# Altium footprint library SparkFun-Retired.PCBLIB: 302 footprints (part 2 of 19)
Each footprint in its own frame and in the unit in brackets; x right, y up, seen from the top. Pads: shape width x height; smd on the part's side, far side on the other; paste and mask are expansions set on the pad; w line width, h text height; cw(c..) or ccw(c..) is an arc to the next point about the centre after c.
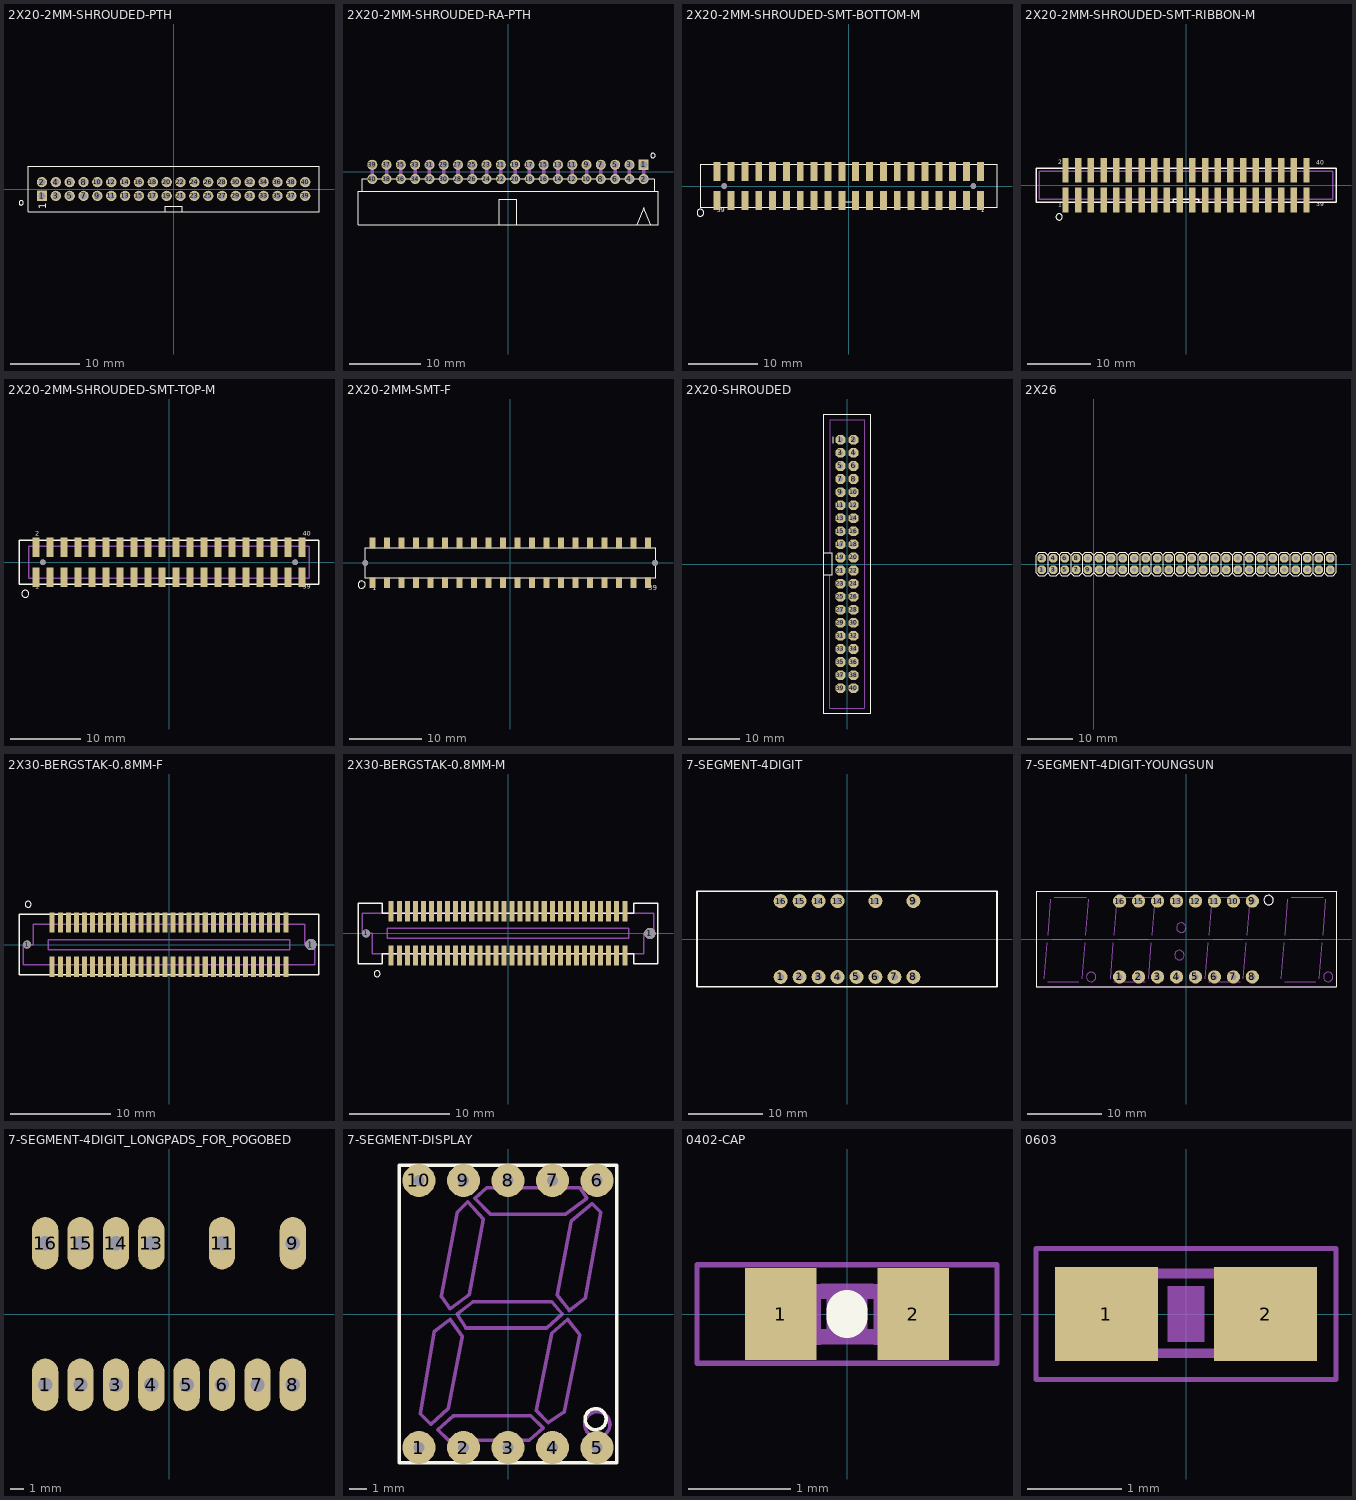
[diagram p1: the footprints below, top view; thin cyan lines are the x and y axes]

## 2X20-2MM-SHROUDED-PTH [mm]
pads (40):
  rect 1.5x1.5 hole 1: 1(-19,-1)
  round 1.5 hole 1: 2(-19,1) 3(-17,-1) 4(-17,1) 5(-15,-1) 6(-15,1) 7(-13,-1) 8(-13,1) 9(-11,-1) 10(-11,1) 11(-9,-1) 12(-9,1) 13(-7,-1) 14(-7,1) 15(-5,-1) 16(-5,1) 17(-3,-1) 18(-3,1) 19(-1,-1) 20(-1,1) 21(1,-1) 22(1,1) 23(3,-1) 24(3,1) 25(5,-1) 26(5,1) 27(7,-1) 28(7,1) 29(9,-1) 30(9,1) 31(11,-1) 32(11,1) 33(13,-1) 34(13,1) 35(15,-1) 36(15,1) 37(17,-1) 38(17,1) 39(19,-1) 40(19,1)
Top Overlay:
  circle w0: c-22,-2 r0.316
  lines w0.127: -1.2,-3.25 -21,-3.25 -21,3.25 21,3.25 21,-3.25 1.2,-3.25 ; -1.2,-3.25 -1.2,-2.5 1.2,-2.5 1.2,-3.25 ; -1.2,-3.25 1.2,-3.25
  text "1" at -18.4,-2.9 h1.08

## 2X20-2MM-SHROUDED-RA-PTH [mm]
pads (40):
  rect 1.406x1.406 hole 1: 1(19,1)
  round 1.406 hole 1: 2(19,-1) 3(17,1) 4(17,-1) 5(15,1) 6(15,-1) 7(13,1) 8(13,-1) 9(11,1) 10(11,-1) 11(9,1) 12(9,-1) 13(7,1) 14(7,-1) 15(5,1) 16(5,-1) 17(3,1) 18(3,-1) 19(1,1) 20(1,-1) 21(-1,1) 22(-1,-1) 23(-3,1) 24(-3,-1) 25(-5,1) 26(-5,-1) 27(-7,1) 28(-7,-1) 29(-9,1) 30(-9,-1) 31(-11,1) 32(-11,-1) 33(-13,1) 34(-13,-1) 35(-15,1) 36(-15,-1) 37(-17,1) 38(-17,-1) 39(-19,1) 40(-19,-1)
Top Overlay:
  circle w0: c20.3,2.3 r0.316
  lines w0.127: -20.5,-2.7 -21,-2.7 -21,-7.4 -1.2,-7.4 ; -20.5,-2.7 20.5,-2.7 ; -20.5,-2.7 -20.5,-1 20.5,-1 20.5,-2.7 ; -1.2,-7.4 1.2,-7.4 ; -1.2,-7.4 -1.2,-3.8 1.2,-3.8 1.2,-7.4 ; 1.2,-7.4 18,-7.4 ; 18,-7.4 20,-7.4 ; 18,-7.4 19,-5 20,-7.4 ; 20,-7.4 21,-7.4 21,-2.7 20.5,-2.7
Mechanical 16:
  rectangle: -19.25,-1 -18.75,1.25
  rectangle: -17.25,-1 -16.75,1.25
  rectangle: -15.25,-1 -14.75,1.25
  rectangle: -13.25,-1 -12.75,1.25
  rectangle: -11.25,-1 -10.75,1.25
  rectangle: -9.25,-1 -8.75,1.25
  rectangle: -7.25,-1 -6.75,1.25
  rectangle: -5.25,-1 -4.75,1.25
  rectangle: -3.25,-1 -2.75,1.25
  rectangle: -1.25,-1 -0.75,1.25
  rectangle: 0.75,-1 1.25,1.25
  rectangle: 2.75,-1 3.25,1.25
  rectangle: 4.75,-1 5.25,1.25
  rectangle: 6.75,-1 7.25,1.25
  rectangle: 8.75,-1 9.25,1.25
  rectangle: 10.75,-1 11.25,1.25
  rectangle: 12.75,-1 13.25,1.25
  rectangle: 14.75,-1 15.25,1.25
  rectangle: 16.75,-1 17.25,1.25
  rectangle: 18.75,-1 19.25,1.25

## 2X20-2MM-SHROUDED-SMT-BOTTOM-M [mm]
pads (42):
  round 0.8 hole 0.8: 1(-18,0) 1(18,0)
  rect 1x2.75 smd: 1(19,-2.125) 2(19,2.125) 3(17,-2.125) 4(17,2.125) 5(15,-2.125) 6(15,2.125) 7(13,-2.125) 8(13,2.125) 9(11,-2.125) 10(11,2.125) 11(9,-2.125) 12(9,2.125) 13(7,-2.125) 14(7,2.125) 15(5,-2.125) 16(5,2.125) 17(3,-2.125) 18(3,2.125) 19(1,-2.125) 20(1,2.125) 21(-1,-2.125) 22(-1,2.125) 23(-3,-2.125) 24(-3,2.125) 25(-5,-2.125) 26(-5,2.125) 27(-7,-2.125) 28(-7,2.125) 29(-9,-2.125) 30(-9,2.125) 31(-11,-2.125) 32(-11,2.125) 33(-13,-2.125) 34(-13,2.125) 35(-15,-2.125) 36(-15,2.125) 37(-17,-2.125) 38(-17,2.125) 39(-19,-2.125) 40(-19,2.125)
Top Overlay:
  circle w0: c-21.41,-3.865 r0.5
  lines w0.127: -1,-3.15 -1,-2.25 1,-2.25 1,-3.15 ; -21.4,-3.15 21.4,-3.15 21.4,3.15 -21.4,3.15 -21.4,-3.15
  text "39" at -19.05,-3.81 h0.69
  text "1" at 19.05,-3.81 h0.69

## 2X20-2MM-SHROUDED-SMT-RIBBON-M [mm]
pads (40):
  rect 1.02x3.9 smd: 1(-19,-2.35) 2(-19,2.35) 3(-17,-2.35) 4(-17,2.35) 5(-15,-2.35) 6(-15,2.35) 7(-13,-2.35) 8(-13,2.35) 9(-11,-2.35) 10(-11,2.35) 11(-9,-2.35) 12(-9,2.35) 13(-7,-2.35) 14(-7,2.35) 15(-5,-2.35) 16(-5,2.35) 17(-3,-2.35) 18(-3,2.35) 19(-1,-2.35) 20(-1,2.35) 21(1,-2.35) 22(1,2.35) 23(3,-2.35) 24(3,2.35) 25(5,-2.35) 26(5,2.35) 27(7,-2.35) 28(7,2.35) 29(9,-2.35) 30(9,2.35) 31(11,-2.35) 32(11,2.35) 33(13,-2.35) 34(13,2.35) 35(15,-2.35) 36(15,2.35) 37(17,-2.35) 38(17,2.35) 39(19,-2.35) 40(19,2.35)
Top Overlay:
  circle w0: c-20,-5 r0.5
  lines w0.203: -2,-2.7 -23.65,-2.7 -23.65,2.7 23.65,2.7 23.65,-2.7 2,-2.7 ; -2,-2.7 -2,-2.2 2,-2.2 2,-2.7 ; -2,-2.7 2,-2.7
  text "1" at -20.15,-3.41 h0.69
  text "2" at -20.15,3.31 h0.69
  text "40" at 20.55,3.21 h0.69
  text "39" at 20.55,-3.31 h0.69
Mechanical 16:
  lines w0.203: -23.15,-2.2 -23.15,2.2 23.15,2.2 23.15,-2.2 -23.15,-2.2

## 2X20-2MM-SHROUDED-SMT-TOP-M [mm]
pads (42):
  rect 1x2.75 smd: 1(-19,-2.125) 2(-19,2.125) 3(-17,-2.125) 4(-17,2.125) 5(-15,-2.125) 6(-15,2.125) 7(-13,-2.125) 8(-13,2.125) 9(-11,-2.125) 10(-11,2.125) 11(-9,-2.125) 12(-9,2.125) 13(-7,-2.125) 14(-7,2.125) 15(-5,-2.125) 16(-5,2.125) 17(-3,-2.125) 18(-3,2.125) 19(-1,-2.125) 20(-1,2.125) 21(1,-2.125) 22(1,2.125) 23(3,-2.125) 24(3,2.125) 25(5,-2.125) 26(5,2.125) 27(7,-2.125) 28(7,2.125) 29(9,-2.125) 30(9,2.125) 31(11,-2.125) 32(11,2.125) 33(13,-2.125) 34(13,2.125) 35(15,-2.125) 36(15,2.125) 37(17,-2.125) 38(17,2.125) 39(19,-2.125) 40(19,2.125)
  round 0.8 hole 0.8: 1(-18,0) 1(18,0)
Top Overlay:
  circle w0: c-20.5,-4.5 r0.5
  lines w0.203: -1,-3.15 -21.4,-3.15 -21.4,3.15 21.4,3.15 21.4,-3.15 1,-3.15 ; -1,-3.15 -1,-2.25 1,-2.25 1,-3.15 ; -1,-3.15 1,-3.15
  text "1" at -19.05,-3.81 h0.69
  text "2" at -19.05,3.81 h0.69
  text "40" at 19.05,3.81 h0.69
  text "39" at 19.05,-3.81 h0.69
Mechanical 16:
  lines w0.203: -20,-2.25 -20,2.25 20,2.25 20,-2.25 -20,-2.25

## 2X20-2MM-SMT-F [mil]
pads (42):
  round 31.5 hole 31.5: 1(-787.4,0) 1(787.4,0)
  rect 31.5x59.06 smd: 1(-748.03,-108.27) 2(-748.03,108.27) 3(-669.29,-108.27) 4(-669.29,108.27) 5(-590.55,-108.27) 6(-590.55,108.27) 7(-511.81,-108.27) 8(-511.81,108.27) 9(-433.07,-108.27) 10(-433.07,108.27) 11(-354.33,-108.27) 12(-354.33,108.27) 13(-275.59,-108.27) 14(-275.59,108.27) 15(-196.85,-108.27) 16(-196.85,108.27) 17(-118.11,-108.27) 18(-118.11,108.27) 19(-39.37,-108.27) 20(-39.37,108.27) 21(39.37,-108.27) 22(39.37,108.27) 23(118.11,-108.27) 24(118.11,108.27) 25(196.85,-108.27) 26(196.85,108.27) 27(275.59,-108.27) 28(275.59,108.27) 29(354.33,-108.27) 30(354.33,108.27) 31(433.07,-108.27) 32(433.07,108.27) 33(511.81,-108.27) 34(511.81,108.27) 35(590.55,-108.27) 36(590.55,108.27) 37(669.29,-108.27) 38(669.29,108.27) 39(748.03,-108.27) 40(748.03,108.27)
Top Overlay:
  circle w0: c-807.09,-118.11 r19.69
  lines w5: -787.4,-82.68 787.4,-82.68 787.4,82.68 -787.4,82.68 -787.4,-82.68
  text "1" at -750,-150 h27.2
  text "39" at 750,-150 h27.2

## 2X20-SHROUDED [mil]
pads (40):
  oct 74x74 hole 40: 1(-50,950) 2(50,950) 3(-50,850) 4(50,850) 5(-50,750) 6(50,750) 7(-50,650) 8(50,650) 9(-50,550) 10(50,550) 11(-50,450) 12(50,450) 13(-50,350) 14(50,350) 15(-50,250) 16(50,250) 17(-50,150) 18(50,150) 19(-50,50) 20(50,50) 21(-50,-50) 22(50,-50) 23(-50,-150) 24(50,-150) 25(-50,-250) 26(50,-250) 27(-50,-350) 28(50,-350) 29(-50,-450) 30(50,-450) 31(-50,-550) 32(50,-550) 33(-50,-650) 34(50,-650) 35(-50,-750) 36(50,-750) 37(-50,-850) 38(50,-850) 39(-50,-950) 40(50,-950)
Top Overlay:
  lines w8: -177.17,-86.61 -118.11,-86.61 -118.11,86.61 -177.17,86.61 ; -109.25,925 -109.25,975 ; 173.23,1147.64 -177.17,1147.64 -177.17,-1147.64 177.17,-1147.64 177.17,1147.64
Mechanical 16:
  rectangle: -60,940 -40,960
  rectangle: 40,940 60,960
  rectangle: 40,840 60,860
  rectangle: -60,840 -40,860
  rectangle: 40,740 60,760
  rectangle: -60,740 -40,760
  rectangle: 40,640 60,660
  rectangle: -60,640 -40,660
  rectangle: 40,540 60,560
  rectangle: -60,540 -40,560
  rectangle: -60,640 -40,660
  rectangle: 40,640 60,660
  rectangle: -60,440 -40,460
  rectangle: 40,440 60,460
  rectangle: 40,340 60,360
  rectangle: -60,340 -40,360
  rectangle: 40,240 60,260
  rectangle: -60,240 -40,260
  rectangle: 40,140 60,160
  rectangle: -60,140 -40,160
  rectangle: 40,40 60,60
  rectangle: -60,40 -40,60
  rectangle: -60,140 -40,160
  rectangle: 40,140 60,160
  rectangle: 40,-60 60,-40
  rectangle: -60,-60 -40,-40
  rectangle: 40,-160 60,-140
  rectangle: -60,-160 -40,-140
  rectangle: 40,-260 60,-240
  rectangle: -60,-260 -40,-240
  rectangle: -60,-160 -40,-140
  rectangle: 40,-160 60,-140
  rectangle: 40,-360 60,-340
  rectangle: 40,-460 60,-440
  rectangle: 40,-560 60,-540
  rectangle: 40,-660 60,-640
  rectangle: 40,-760 60,-740
  rectangle: 40,-860 60,-840
  rectangle: 40,-960 60,-940
  rectangle: -60,-360 -40,-340
  rectangle: -60,-460 -40,-440
  rectangle: -60,-560 -40,-540
  rectangle: -60,-660 -40,-640
  rectangle: -60,-760 -40,-740
  rectangle: -60,-860 -40,-840
  rectangle: -60,-960 -40,-940
  lines w8: -133.86,-86.61 -133.86,-1104.33 133.86,-1104.33 133.86,1104.33 -133.86,1104.33 -133.86,86.61

## 2X26 [mil]
pads (52):
  oct 74x74 hole 40: 1(-450,-50) 2(-450,50) 3(-350,-50) 4(-350,50) 5(-250,-50) 6(-250,50) 7(-150,-50) 8(-150,50) 9(-50,-50) 10(-50,50) 11(50,-50) 12(50,50) 13(150,-50) 14(150,50) 15(250,-50) 16(250,50) 17(350,-50) 18(350,50) 19(450,-50) 20(450,50) 21(550,-50) 22(550,50) 23(650,-50) 24(650,50) 25(750,-50) 26(750,50) 27(850,-50) 28(850,50) 29(950,-50) 30(950,50) 31(1050,-50) 32(1050,50) 33(1150,-50) 34(1150,50) 35(1250,-50) 36(1250,50) 37(1350,-50) 38(1350,50) 39(1450,-50) 40(1450,50) 41(1550,-50) 42(1550,50) 43(1650,-50) 44(1650,50) 45(1750,-50) 46(1750,50) 47(1850,-50) 48(1850,50) 49(1950,-50) 50(1950,50) 51(2050,-50) 52(2050,50)
Top Overlay:
  drawing of 183 lines, arcs and shapes, not listed
Mechanical 16:
  rectangle: -460,-60 -440,-40
  rectangle: -460,40 -440,60
  rectangle: -360,40 -340,60
  rectangle: -360,-60 -340,-40
  rectangle: -260,40 -240,60
  rectangle: -260,-60 -240,-40
  rectangle: -160,40 -140,60
  rectangle: -60,40 -40,60
  rectangle: 40,40 60,60
  rectangle: -160,-60 -140,-40
  rectangle: -60,-60 -40,-40
  rectangle: 40,-60 60,-40
  rectangle: 140,40 160,60
  rectangle: 140,-60 160,-40
  rectangle: 240,40 260,60
  rectangle: 240,-60 260,-40
  rectangle: 340,40 360,60
  rectangle: 340,-60 360,-40
  rectangle: 440,40 460,60
  rectangle: 440,-60 460,-40
  rectangle: 540,-60 560,-40
  rectangle: 540,40 560,60
  rectangle: 640,40 660,60
  rectangle: 640,-60 660,-40
  rectangle: 740,40 760,60
  rectangle: 740,-60 760,-40
  rectangle: 840,40 860,60
  rectangle: 940,40 960,60
  rectangle: 1040,40 1060,60
  rectangle: 840,-60 860,-40
  rectangle: 940,-60 960,-40
  rectangle: 1040,-60 1060,-40
  rectangle: 1140,40 1160,60
  rectangle: 1140,-60 1160,-40
  rectangle: 1240,40 1260,60
  rectangle: 1240,-60 1260,-40
  rectangle: 1340,40 1360,60
  rectangle: 1340,-60 1360,-40
  rectangle: 1440,40 1460,60
  rectangle: 1440,-60 1460,-40
  rectangle: 1540,40 1560,60
  rectangle: 1640,40 1660,60
  rectangle: 1540,-60 1560,-40
  rectangle: 1640,-60 1660,-40
  rectangle: 1740,40 1760,60
  rectangle: 1740,-60 1760,-40
  rectangle: 1840,40 1860,60
  rectangle: 1840,-60 1860,-40
  rectangle: 1940,40 1960,60
  rectangle: 1940,-60 1960,-40
  rectangle: 2040,40 2060,60
  rectangle: 2040,-60 2060,-40

## 2X30-BERGSTAK-0.8MM-F [mm]
pads (62):
  round 0.8 hole 0.8: 1(-14.1,0)
  rect 0.5x2 smd: 1(-11.6,2.2) 2(-11.6,-2.2) 3(-10.8,2.2) 4(-10.8,-2.2) 5(-10,2.2) 6(-10,-2.2) 7(-9.2,2.2) 8(-9.2,-2.2) 9(-8.4,2.2) 10(-8.4,-2.2) 11(-7.6,2.2) 12(-7.6,-2.2) 13(-6.8,2.2) 14(-6.8,-2.2) 15(-6,2.2) 16(-6,-2.2) 17(-5.2,2.2) 18(-5.2,-2.2) 19(-4.4,2.2) 20(-4.4,-2.2) 21(-3.6,2.2) 22(-3.6,-2.2) 23(-2.8,2.2) 24(-2.8,-2.2) 25(-2,2.2) 26(-2,-2.2) 27(-1.2,2.2) 28(-1.2,-2.2) 29(-0.4,2.2) 30(-0.4,-2.2) 31(0.4,2.2) 32(0.4,-2.2) 33(1.2,2.2) 34(1.2,-2.2) 35(2,2.2) 36(2,-2.2) 37(2.8,2.2) 38(2.8,-2.2) 39(3.6,2.2) 40(3.6,-2.2) 41(4.4,2.2) 42(4.4,-2.2) 43(5.2,2.2) 44(5.2,-2.2) 45(6,2.2) 46(6,-2.2) 47(6.8,2.2) 48(6.8,-2.2) 49(7.6,2.2) 50(7.6,-2.2) 51(8.4,2.2) 52(8.4,-2.2) 53(9.2,2.2) 54(9.2,-2.2) 55(10,2.2) 56(10,-2.2) 57(10.8,2.2) 58(10.8,-2.2) 59(11.6,2.2) 60(11.6,-2.2)
  round 1.12 hole 1.12: 1(14.1,0)
Top Overlay:
  circle w0: c-14,4 r0.3
  lines w0.127: -14.9,-3 14.9,-3 14.9,3 -14.9,3 -14.9,-3
Mechanical 16:
  lines w0.127: -14.5,-2 14.5,-2 14.5,0 13.5,0 13.5,2 -13.5,2 -13.5,0 -14.5,0 -14.5,-2 ; -12,-0.5 12,-0.5 12,0.5 -12,0.5 -12,-0.5

## 2X30-BERGSTAK-0.8MM-M [mm]
pads (62):
  round 0.8 hole 0.8: 1(-14.1,0)
  rect 0.5x2 smd: 1(-11.6,-2.2) 2(-11.6,2.2) 3(-10.8,-2.2) 4(-10.8,2.2) 5(-10,-2.2) 6(-10,2.2) 7(-9.2,-2.2) 8(-9.2,2.2) 9(-8.4,-2.2) 10(-8.4,2.2) 11(-7.6,-2.2) 12(-7.6,2.2) 13(-6.8,-2.2) 14(-6.8,2.2) 15(-6,-2.2) 16(-6,2.2) 17(-5.2,-2.2) 18(-5.2,2.2) 19(-4.4,-2.2) 20(-4.4,2.2) 21(-3.6,-2.2) 22(-3.6,2.2) 23(-2.8,-2.2) 24(-2.8,2.2) 25(-2,-2.2) 26(-2,2.2) 27(-1.2,-2.2) 28(-1.2,2.2) 29(-0.4,-2.2) 30(-0.4,2.2) 31(0.4,-2.2) 32(0.4,2.2) 33(1.2,-2.2) 34(1.2,2.2) 35(2,-2.2) 36(2,2.2) 37(2.8,-2.2) 38(2.8,2.2) 39(3.6,-2.2) 40(3.6,2.2) 41(4.4,-2.2) 42(4.4,2.2) 43(5.2,-2.2) 44(5.2,2.2) 45(6,-2.2) 46(6,2.2) 47(6.8,-2.2) 48(6.8,2.2) 49(7.6,-2.2) 50(7.6,2.2) 51(8.4,-2.2) 52(8.4,2.2) 53(9.2,-2.2) 54(9.2,2.2) 55(10,-2.2) 56(10,2.2) 57(10.8,-2.2) 58(10.8,2.2) 59(11.6,-2.2) 60(11.6,2.2)
  round 1.12 hole 1.12: 1(14.1,0)
Top Overlay:
  circle w0: c-13,-4 r0.3
  lines w0.127: -14.9,-3 -12.5,-3 -12.5,-2 12.5,-2 12.5,-3 14.9,-3 14.9,3 12.5,3 12.5,2 -12.5,2 -12.5,3 -14.9,3 -14.9,-3
Mechanical 16:
  lines w0.127: -14.5,0 -13.5,0 -13.5,-2 13.5,-2 13.5,0 14.5,0 14.5,2 -14.5,2 -14.5,0 ; -12,-0.5 12,-0.5 12,0.5 -12,0.5 -12,-0.5

## 7-SEGMENT-4DIGIT [mil]
pads (14):
  round 74 hole 35.43: 1(-350,-200) 2(-250,-200) 3(-150,-200) 4(-50,-200) 5(50,-200) 6(150,-200) 7(250,-200) 8(350,-200) 9(350,200) 11(150,200) 13(-50,200) 14(-150,200) 15(-250,200) 16(-350,200)
Top Overlay:
  lines w8: -791,-252 791,-252 791,252 -791,252 -791,-252

## 7-SEGMENT-4DIGIT-YOUNGSUN [mil]
pads (16):
  round 70 hole 31.5: 1(-350,-200) 2(-250,-200) 3(-150,-200) 4(-50,-200) 5(50,-200) 6(150,-200) 7(250,-200) 8(350,-200) 9(350,200) 10(250,200) 11(150,200) 12(50,200) 13(-50,200) 14(-150,200) 15(-250,200) 16(-350,200)
Top Overlay:
  circle w5: c435.63,205.32 r25
  lines w5: -790.94,-251.97 -790.94,251.97 790.94,251.97 790.94,-251.97 -790.94,-251.97
Mechanical 16:
  circle w5: c-500,-200 r25
  circle w5: c-150,-200 r25
  circle w5: c350,-200 r25
  circle w5: c750,-200 r25
  circle w5: c-25,60 r25
  circle w5: c-35,-85 r25
  circle w5: c435,205 r25
  lines w5: -750,-210 -735,-20 ; -730,-225 -565,-225 ; -730,20 -715,210 ; -705,0 -550,0 ; -695,220 -525,220 ; -550,-210 -535,-20 ; -530,20 -515,210 ; -400,-210 -385,-20 ; -380,-225 -215,-225 ; -380,20 -365,210 ; -355,0 -200,0 ; -345,220 -175,220 ; -200,-210 -185,-20 ; -180,20 -165,210 ; 100,-210 115,-20 ; 120,-225 285,-225 ; 120,20 135,210 ; 145,0 300,0 ; 155,220 325,220 ; 300,-210 315,-20 ; 320,20 335,210 ; 500,-210 515,-20 ; 520,-225 685,-225 ; 520,20 535,210 ; 545,0 700,0 ; 555,220 725,220 ; 700,-210 715,-20 ; 720,20 735,210 ; -790.94,-251.97 790.94,-251.97 790.94,251.97 -790.94,251.97 -790.94,-251.97

## 7-SEGMENT-4DIGIT_LONGPADS_FOR_POGOBED [mil]
pads (14):
  oval 74x148 hole 40: 1(-350,-200) 2(-250,-200) 3(-150,-200) 4(-50,-200) 5(50,-200) 6(150,-200) 7(250,-200) 8(350,-200) 9(350,200) 11(150,200) 13(-50,200) 14(-150,200) 15(-250,200) 16(-350,200)

## 7-SEGMENT-DISPLAY [mil]
pads (10):
  round 74 hole 25.59: 1(-200,-300) 2(-100,-300) 3(0,-300) 4(100,-300) 5(200,-300) 6(200,300) 7(100,300) 8(0,300) 9(-100,300) 10(-200,300)
Top Overlay:
  circle w8: c196.85,-236.22 r23.62
  lines w8: -244.09,-334.65 -244.09,334.65 244.09,334.65 244.09,-334.65 -244.09,-334.65
Mechanical 16:
  circle w8: c200.79,-248.03 r28.39
  lines w8: -196.85,-224.41 -165.35,-39.37 -129.92,-11.81 -102.36,-51.18 -133.86,-212.6 -173.23,-248.03 -196.85,-224.41 ; -157.48,-259.84 -133.86,-283.46 47.24,-283.46 78.74,-255.91 51.18,-228.35 -122.05,-228.35 -157.48,-259.84 ; -149.61,39.37 -129.92,11.81 -86.61,43.31 -55.12,212.6 -90.55,251.97 -114.17,228.35 -149.61,39.37 ; -114.17,0 -94.49,-31.5 86.61,-31.5 122.05,0 98.43,27.56 -78.74,27.56 -114.17,0 ; -74.8,259.84 -47.24,283.46 161.42,283.46 177.17,259.84 129.92,224.41 -39.37,224.41 -74.8,259.84 ; 62.99,-216.54 90.55,-244.09 125.98,-220.47 161.42,-47.24 133.86,-11.81 98.43,-43.31 62.99,-216.54 ; 110.24,43.31 137.8,7.87 173.23,35.43 208.66,228.35 188.98,248.03 141.73,208.66 110.24,43.31
  text "160-1576-5-ND" at -350,-450 h77.5

## 0402-CAP [mm]
pads (2):
  rect 0.7x0.9 smd: 1(-0.65,0) 2(0.65,0)
Top Overlay:
  lines w0.406: 0,-0.03 0,0.03
Mechanical 6:
  rectangle: -0.2,-0.3 0.2,0.3
Mechanical 16:
  rectangle: -0.554,-0.305 -0.254,0.295
  rectangle: 0.259,-0.305 0.559,0.295
  lines w0.152: -0.245,-0.224 0.245,-0.224 ; -0.245,0.224 0.245,0.224
Mechanical 27:
  lines w0.051: -1.473,-0.483 1.473,-0.483 1.473,0.483 -1.473,0.483 -1.473,-0.483

## 0603 [mm]
pads (2):
  rect 1.1x1 smd: 1(-0.85,0) 2(0.85,0)
Mechanical 6:
  rectangle: -0.2,-0.3 0.2,0.3
Mechanical 16:
  rectangle: -0.838,-0.47 -0.338,0.48
  rectangle: 0.33,-0.47 0.83,0.48
  lines w0.102: -0.356,-0.419 0.356,-0.419 ; -0.356,0.432 0.356,0.432
Mechanical 27:
  lines w0.051: -1.6,-0.7 1.6,-0.7 1.6,0.7 -1.6,0.7 -1.6,-0.7